# Altium footprint library pw.PcbLib: 210 footprints (part 8 of 14)
Each footprint in its own frame and in the unit in brackets; x right, y up, seen from the top. Pads: shape width x height; smd on the part's side, far side on the other; paste and mask are expansions set on the pad; w line width, h text height; cw(c..) or ccw(c..) is an arc to the next point about the centre after c.
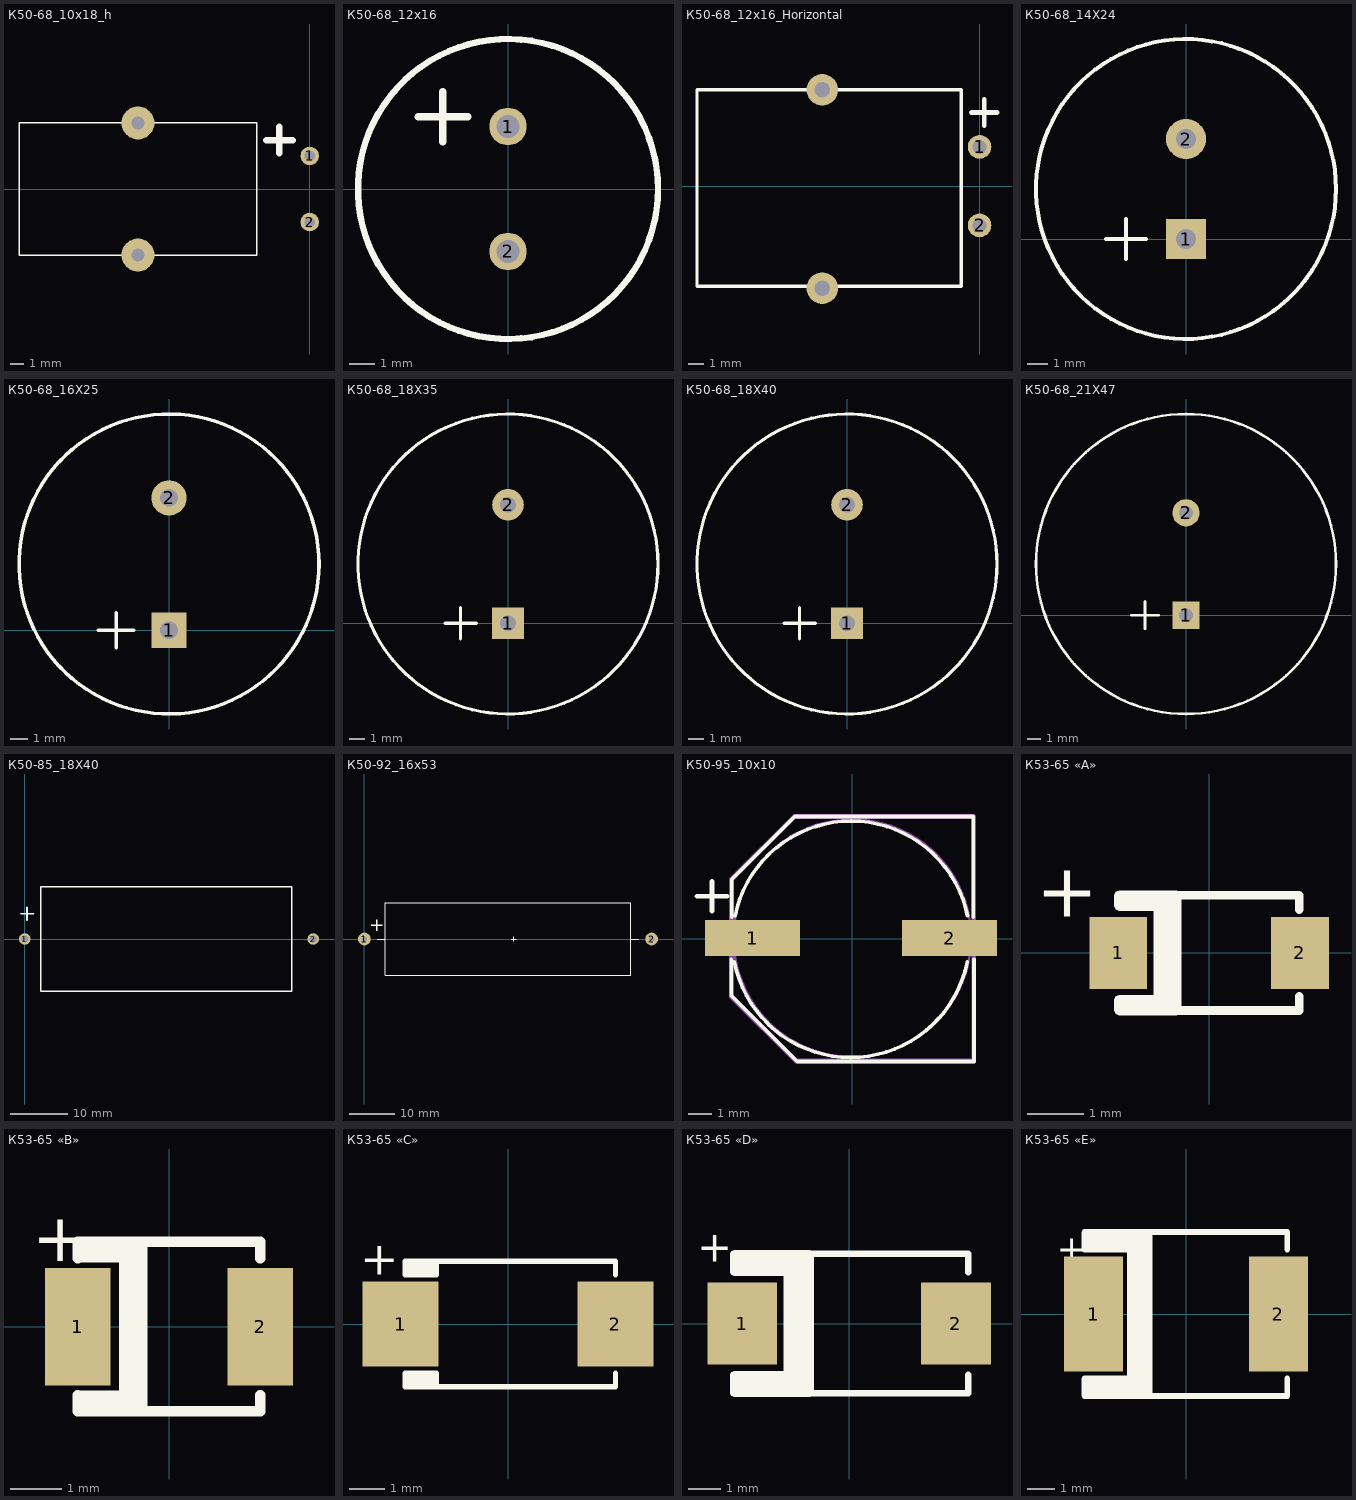
[diagram p7: the footprints below, top view; thin cyan lines are the x and y axes]

## К50-68_10x18_h [mm]
height 11
pads (4):
  round 1.4 hole 0.8: 1(0,2.5) 2(0,-2.5)
  round 2.5 hole 1 unplated: ""(-13,-5) ""(-13,5)
Top Overlay:
  lines w0.1: -22,-5 -22,-2 -22,5 -4,5 -4,0 -4,-5 -22,-5
  lines w0.5: -3.3,3.7 -1.3,3.7 ; -2.3,2.7 -2.3,4.7
3D body "User Library-CAPAER_D100_L180_P050_W006X030.STEP": height 10, standoff 0, extent -22.013,-5.01 -1,5

## К50-68_12x16 [mm]
height 30
pads (2):
  round 1.5 hole 0.9 unplated: 1(0,2.5) 2(0,-2.5)
Top Overlay:
  circle w0.254: c0,0 r6
  lines w0.3: -3.6,2.9 -1.6,2.9 ; -2.6,1.9 -2.6,3.9
3D body "User Library-CAPAER_D125_L165_P050_W006X030.STEP": height 16.52, standoff -3, extent -6.25,-6.26 6.25,6.25

## К50-68_12x16_Horizontal [mm]
height 30
pads (4):
  round 1.5 hole 0.9 unplated: 1(0,2.5) 2(0,-2.5)
  round 2 hole 1 unplated: ""(-10.02,-6.5) ""(-10.02,6.137)
Top Overlay:
  lines w0.2: -18,-6.375 -18,6.137 -1.17,6.137 -1.17,-6.375 -18,-6.375
  lines w0.3: -0.51,4.69 1.11,4.69 ; 0.3,3.84 0.3,5.54
3D body "User Library-CAPAER_D125_L165_P050_W006X030.STEP": height 12.45, standoff -0.05, extent -17.965,-6.386 1.555,6.124

## К50-68_14X24 [mm]
height 30
pads (2):
  rect 2x2 hole 1 unplated: 1(0,0)
  round 2 hole 1 unplated: 2(0,5)
Top Overlay:
  circle w0.2: c0,2.5 r7.5
  lines w0.2: -4,0 -2,0 ; -3,-1 -3,1
3D body "К50-68_14x24.stp": height 24.25, standoff -2.75, extent -7,-4.5 7,9.5

## К50-68_16X25 [mm]
height 30
pads (2):
  rect 2x2 hole 1 unplated: 1(0,0)
  round 2 hole 1 unplated: 2(0,7.5)
Top Overlay:
  circle w0.2: c0,3.75 r8.5
  lines w0.2: -4,0 -2,0 ; -3,-1 -3,1
3D body "К50-68_16x25.stp": height 25.25, standoff -2.75, extent -8,-4.246 8,11.747

## К50-68_18X35 [mm]
height 30
pads (2):
  rect 2x2 hole 1 unplated: 1(0,0)
  round 2 hole 1 unplated: 2(0,7.5)
Top Overlay:
  circle w0.2: c0,3.75 r9.5
  lines w0.2: -4,0 -2,0 ; -3,-1 -3,1
3D body "К50-68_18x35.stp": height 35.25, standoff -2.75, extent -9,-5.25 9,12.75

## К50-68_18X40 [mm]
height 30
pads (2):
  rect 2x2 hole 1 unplated: 1(0,0)
  round 2 hole 1 unplated: 2(0,7.5)
Top Overlay:
  circle w0.2: c0,3.75 r9.5
  lines w0.2: -4,0 -2,0 ; -3,-1 -3,1
3D body "К50-68_18x40.stp": height 40.25, standoff -2.75, extent -9,-5.244 9,12.745

## К50-68_21X47 [mm]
height 30
pads (2):
  rect 2x2 hole 1 unplated: 1(0,0)
  round 2 hole 1 unplated: 2(0,7.5)
Top Overlay:
  circle w0.2: c0,3.75 r11
  lines w0.2: -4,0 -2,0 ; -3,-1 -3,1
3D body "К50-68_21x47.stp": height 47.25, standoff -2.75, extent -10.5,-6.743 10.5,14.244

## К50-85_18X40 [mm]
pads (2):
  round 2 hole 1.3 unplated: 1(0,0) 2(50,0)
Top Overlay:
  lines w0.25: 2.8,-9.1 46.3,-9.1 46.3,0 46.3,9.1 2.8,9.1 2.8,0 2.8,-9.1
  lines w0.3: -0.7,4.4 1.5,4.4 ; 0.4,3.3 0.4,5.5

## К50-92_16x53 [mm]
pads (2):
  round 2.8 hole 1.2: 1(0,0) 2(63,0)
Top Overlay:
  lines w0.2: 2.8,0 4.575,0 ; 32.262,0 33.278,0 ; 32.77,-0.508 32.77,0.508 ; 58.425,0 60.2,0 ; 4.575,0 4.575,8 58.425,8 58.425,-8 4.575,-8 4.575,0
  text "+" at 1.025,1.725 h3
3D body: height 16, standoff 0, extent 5,-8.175 58,7.825

## К50-95_10x10 [mm]
pads (2):
  rect 4x1.524 smd: 1(-4.211,0.03) 2(4.089,0.03)
Top Overlay:
  lines w0.152: -5.101,-0.859 -5.101,-2.4 -2.331,-5.17 5.119,-5.17 5.119,-0.859 ; -5.081,0.919 -5.081,2.5 -2.431,5.15 5.089,5.15 5.089,0.919 ; -4.982,-0.962 ccw(c-0.074,-0.003) 4.831,-0.974 ; -4.949,0.964 cw(c-0.051,-0.04) 4.846,0.969
  lines w0.2: -6.551,1.79 -5.281,1.79 ; -5.916,1.155 -5.916,2.425
Mechanical 1:
  circle w0.102: c-0.011,0.03 r5
  lines w0.2: -5.101,-2.44 -2.391,-5.15 5.109,-5.15 5.109,5.15 -2.451,5.15 -5.101,2.5 -5.101,-2.44
3D body "User Library-cap_10x10x10-1.STEP": height 10.6, standoff 0.1, extent -5.901,-5.25 5.899,5.25

## К53-65 «A» [mil]
pads (2):
  rect 40x50 smd: 1(-63,0) 2(63,0)
Top Overlay:
  region: -20.2,42.3 -19.25,40 -19.25,-40 -20.2,-42.3 -22.5,-43.25 -62.5,-43.25 -64.8,-42.3 -65.75,-40 -65.75,-32.5 -64.8,-30.2 -62.5,-29.25 -38.25,-29.25 -38.25,29.25 -62.5,29.25 -64.8,30.2 -65.75,32.5 -65.75,40 -64.8,42.3 -62.5,43.25 -22.5,43.25
  lines w6: -62.5,-32.5 -62.5,-40 62.5,-40 62.5,-30 ; -62.5,32.5 -62.5,40 62.5,40 62.5,30
  text "+" at -120,25 h37.5
3D body "User Library-Tantalum Capacitor Case A.STEP": height 65, standoff 0.04, extent -68.71,-29.92 64.77,33.07

## К53-65 «B» [mil]
pads (2):
  rect 50x90 smd: 1(-70,0) 2(70,0)
Top Overlay:
  region: -17.7,67.3 -16.75,65 -16.75,-65 -17.7,-67.3 -20,-68.25 -70,-68.25 -72.3,-67.3 -73.25,-65 -73.25,-52.5 -72.3,-50.2 -70,-49.25 -38.25,-49.25 -38.25,49.25 -70,49.25 -72.3,50.2 -73.25,52.5 -73.25,65 -72.3,67.3 -70,68.25 -20,68.25
  lines w8: -70,-52.5 -70,-65 70,-65 70,-52.5 ; -70,52.5 -70,65 70,65 70,52.5
  text "+" at -105,50 h37.5
Mechanical 3:
  text "JK" at -100,-30 h37.5
3D body "User Library-Tantalum Capacitor Case B.STEP": height 80.25, standoff -2.43, extent -71.7,-55.53 73.59,55.5

## К53-65 «C» [mil]
pads (2):
  rect 85x95 smd: 1(-120,0) 2(120,0)
Top Overlay:
  lines w6: -110,70 -110,55 -105,55 -105,70 -100,70 -100,55 -95,55 -95,70 -90,70 -90,55 -85,55 -85,70 -80,70 -80,55 -115,55 -115,70 120,70 120,55 ; 120,-55 120,-70 -115,-70 ; -115,-70 -115,-55 ; -115,-70 -110,-70 -110,-55 -105,-55 -105,-70 -100,-70 -100,-55 -95,-55 -95,-70 -90,-70 -90,-55 -85,-55 -85,-70 -80,-70 -80,-55 -115,-55 ; -115,-70 -115,-55
  text "+" at -165,55 h37.5
3D body "User Library-Tantalum Capacitor Case C.STEP": height 105.27, standoff -0.59, extent -120.62,-65.2 122.89,60.99

## К53-65 «D» [mil]
pads (2):
  rect 85x100 smd: 1(-130,0) 2(130,0)
Top Overlay:
  region: -44.44,88.06 -43.17,85 -43.17,-85 -44.44,-88.06 -47.5,-89.33 -140,-89.33 -143.06,-88.06 -144.33,-85 -144.33,-62.5 -143.06,-59.44 -140,-58.17 -79.33,-58.17 -79.33,58.17 -140,58.17 -143.06,59.44 -144.33,62.5 -144.33,85 -143.06,88.06 -140,89.33 -47.5,89.33
  lines w8: -140,-62.5 -140,-85 145,-85 145,-62.5 ; -140,62.5 -140,85 145,85 145,62.5
  text "+" at -185,75 h37.5
Mechanical 3:
  text "JK" at -160,-30 h37.5
3D body "User Library-Tantalum Cap Case D.STEP": height 110.24, standoff 0, extent -130.31,-85.43 150.79,83.86

## К53-65 «E» [mil]
pads (2):
  rect 85x165 smd: 1(-132.5,0) 2(132.5,0)
Top Overlay:
  region: -49.44,120.56 -48.17,117.5 -48.17,-117.5 -49.44,-120.56 -52.5,-121.83 -145,-121.83 -148.06,-120.56 -149.33,-117.5 -149.33,-92.5 -148.06,-89.44 -145,-88.17 -84.33,-88.17 -84.33,88.17 -145,88.17 -148.06,89.44 -149.33,92.5 -149.33,117.5 -148.06,120.56 -145,121.83 -52.5,121.83
  lines w8: -145,-92.5 -145,-117.5 145,-117.5 145,-92.5 ; -145,92.5 -145,117.5 145,117.5 145,92.5
  text "+" at -185,75 h37.5
Mechanical 3:
  text "JK" at -172.5,-30 h37.5
3D body "User Library-CaseE_7260-38.step": height 141.73, standoff 0, extent -142.51,-118.89 144.89,117.33